# Altium footprint library SMT.PcbLib: 151 footprints (part 10 of 10)
Each footprint in its own frame and in the unit in brackets; x right, y up, seen from the top. Pads: shape width x height; smd on the part's side, far side on the other; paste and mask are expansions set on the pad; w line width, h text height; cw(c..) or ccw(c..) is an arc to the next point about the centre after c.
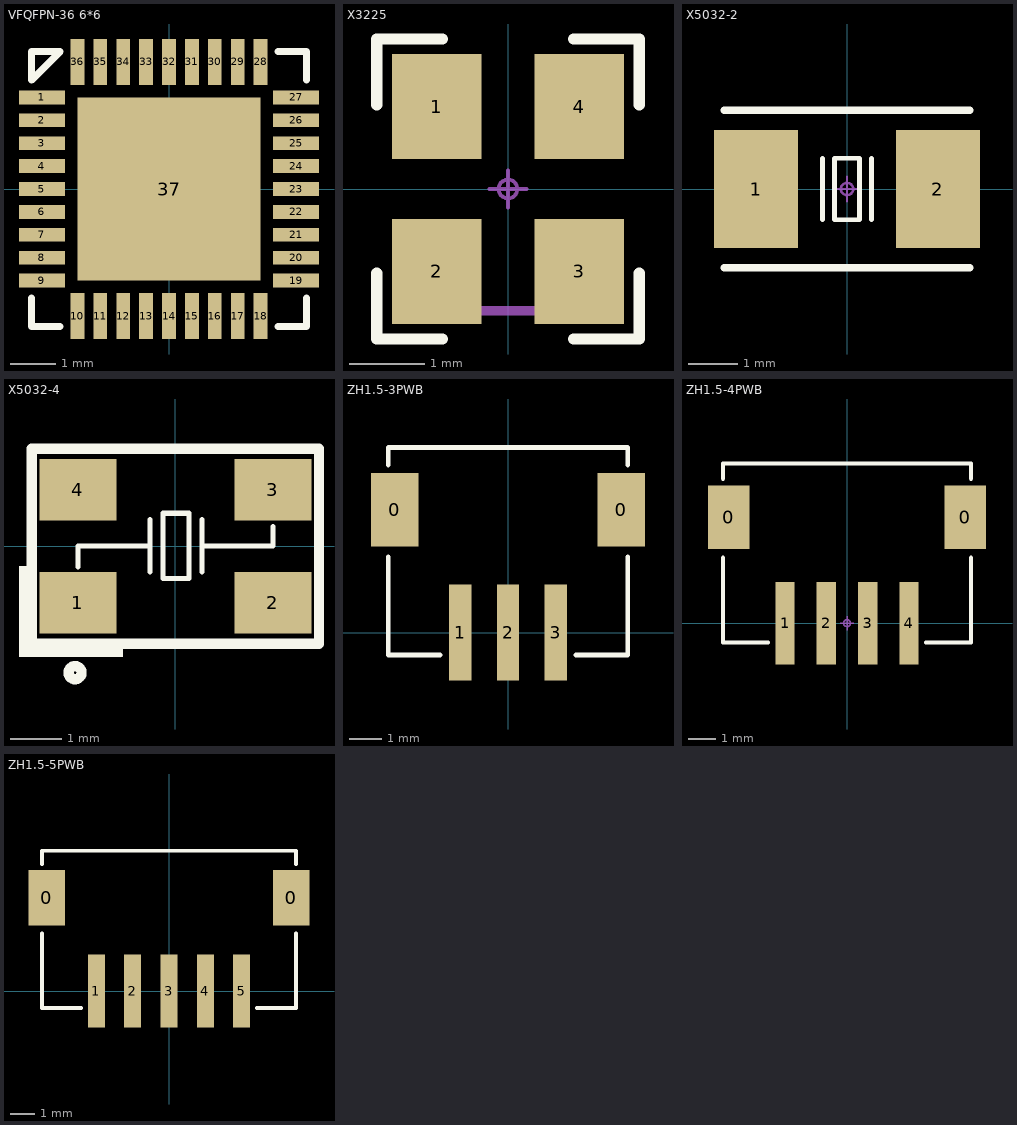
[diagram p9: the footprints below, top view; thin cyan lines are the x and y axes]

## VFQFPN-36 6*6 [mm]
pads (37):
  rect 1x0.3 smd mask+0.051: 1(-2.775,2) 2(-2.775,1.5) 3(-2.775,1) 4(-2.775,0.5) 5(-2.775,0) 6(-2.775,-0.5) 7(-2.775,-1) 8(-2.775,-1.5) 9(-2.775,-2) 19(2.775,-2) 20(2.775,-1.5) 21(2.775,-1) 22(2.775,-0.5) 23(2.775,0) 24(2.775,0.5) 25(2.775,1) 26(2.775,1.5) 27(2.775,2)
  rect 0.3x1 smd mask+0.051: 10(-2,-2.775) 11(-1.5,-2.775) 12(-1,-2.775) 13(-0.5,-2.775) 14(0,-2.775) 15(0.5,-2.775) 16(1,-2.775) 17(1.5,-2.775) 18(2,-2.775) 28(2,2.775) 29(1.5,2.775) 30(1,2.775) 31(0.5,2.775) 32(0,2.775) 33(-0.5,2.775) 34(-1,2.775) 35(-1.5,2.775) 36(-2,2.775)
  rect 4x4 smd mask+0.051: 37(0,0)
Top Overlay:
  lines w0.152: -3,-2.375 -3,-3 -2.375,-3 ; 2.375,-3 3,-3 3,-2.375 ; 2.375,3 3,3 3,2.375 ; -3,2.375 -3,3 -2.375,3 -3,2.375
Mechanical 15:
  circle w0.05: c0,0 r0.125
  lines w0.05: -0.25,0 0.25,0 ; 0,-0.25 0,0.25
3D body "qfn36.stp": height 0.8, standoff -0.01, extent -2.946,-2.949 2.924,2.921

## X3225 [mm]
pads (4):
  rect 1.2x1.4 smd: 1(-0.95,1.1) 3(0.95,-1.1) 4(0.95,1.1)
  rect 1.2x1.4 smd paste-0.02: 2(-0.95,-1.1)
Top Overlay:
  lines w0.152: -1.75,-1.125 -1.75,-2 -0.875,-2 ; -1.75,1.125 -1.75,2 -0.875,2 ; 0.875,-2 1.75,-2 1.75,-1.125 ; 0.875,2 1.75,2 1.75,1.125
Mechanical 13:
  lines w0.127: -1.25,-1.625 1.25,-1.625
Mechanical 15:
  circle w0.05: c0,0 r0.125
  lines w0.05: -0.25,0 0.25,0 ; 0,-0.25 0,0.25
3D body "XTAL-3225.STEP": height 0.8, standoff 0, extent -1.25,-1.6 1.25,1.6

## X5032-2 [mm]
pads (2):
  rect 1.7x2.4 smd: 1(-1.85,0) 2(1.85,0)
Top Overlay:
  lines w0.1: -0.5,-0.625 -0.5,0.625 ; 0.5,-0.625 0.5,0.625 ; -0.25,-0.625 0.25,-0.625 0.25,0.625 -0.25,0.625 -0.25,-0.625
  lines w0.152: -2.5,-1.6 2.5,-1.6 ; -2.5,1.6 2.5,1.6
Mechanical 15:
  circle w0.05: c0,0 r0.125
  lines w0.05: -0.25,0 0.25,0 ; 0,-0.25 0,0.25
3D body: height 1, standoff 0, extent -2.5,-1.6 2.5,1.6

## X5032-4 [mm]
pads (4):
  rect 1.5x1.2 smd: 1(-1.9,-1.1) 2(1.9,-1.1) 3(1.9,1.1) 4(-1.9,1.1)
Top Overlay:
  circle w0.2: c-1.956,-2.464 r0.127
  rectangle: -3.023,-2.159 -1.016,-1.905
  rectangle: -3.048,-2.159 -2.87,-0.381
  lines w0.1: -1.897,-0.406 -1.897,0.008 -0.496,0.008 ; -0.496,-0.5 -0.496,0.516 ; 0.52,-0.5 0.52,0.516 ; 0.52,0.008 1.902,0.008 1.905,0.016 1.905,0.381 ; -0.242,-0.627 -0.242,0.643 0.266,0.643 0.266,0.326 0.266,-0.309 0.266,-0.627 -0.242,-0.627
  lines w0.2: -2.8,-1.9 2.8,-1.9 2.8,1.9 -2.8,1.9 -2.8,-1.9
3D body: height 1, standoff 0, extent -2.5,-1.6 2.5,1.6

## ZH1.5-3PWB [mm]
pads (5):
  rect 1.5x2.3 smd: 0(-3.55,3.85) 0(3.55,3.85)
  rect 0.7x3 smd: 1(-1.5,0) 2(0,0) 3(1.5,0)
Top Overlay:
  lines w0.152: -3.75,2.375 -3.75,-0.7 -2.125,-0.7 ; -3.75,5.25 -3.75,5.8 3.75,5.8 3.75,5.25 ; 2.125,-0.7 3.75,-0.7 3.75,2.375
Mechanical 15:
  circle w0.05: c0,0 r0.125
  lines w0.05: -0.25,0 0.25,0 ; 0,-0.25 0,0.25

## ZH1.5-4PWB [mm]
pads (6):
  rect 1.5x2.3 smd: 0(-4.3,3.85) 0(4.3,3.85)
  rect 0.7x3 smd: 1(-2.25,0) 2(-0.75,0) 3(0.75,0) 4(2.25,0)
Top Overlay:
  lines w0.152: -4.5,2.375 -4.5,-0.7 -2.875,-0.7 ; -4.5,5.25 -4.5,5.8 4.5,5.8 4.5,5.25 ; 2.875,-0.7 4.5,-0.7 4.5,2.375
Mechanical 15:
  circle w0.05: c0,0 r0.125
  lines w0.05: -0.25,0 0.25,0 ; 0,-0.25 0,0.25

## ZH1.5-5PWB [mm]
pads (7):
  rect 1.5x2.3 smd: 0(-5.05,3.85) 0(5.05,3.85)
  rect 0.7x3 smd: 1(-3,0) 2(-1.5,0) 3(0,0) 4(1.5,0) 5(3,0)
Top Overlay:
  lines w0.152: -5.25,2.375 -5.25,-0.7 -3.625,-0.7 ; -5.25,5.25 -5.25,5.8 5.25,5.8 5.25,5.25 ; 3.625,-0.7 5.25,-0.7 5.25,2.375
Mechanical 15:
  circle w0.05: c0,0 r0.125
  lines w0.05: -0.25,0 0.25,0 ; 0,-0.25 0,0.25